# Altium footprint library FTP.PcbLib: 70 footprints (part 3 of 5)
Each footprint in its own frame and in the unit in brackets; x right, y up, seen from the top. Pads: shape width x height; smd on the part's side, far side on the other; paste and mask are expansions set on the pad; w line width, h text height; cw(c..) or ccw(c..) is an arc to the next point about the centre after c.
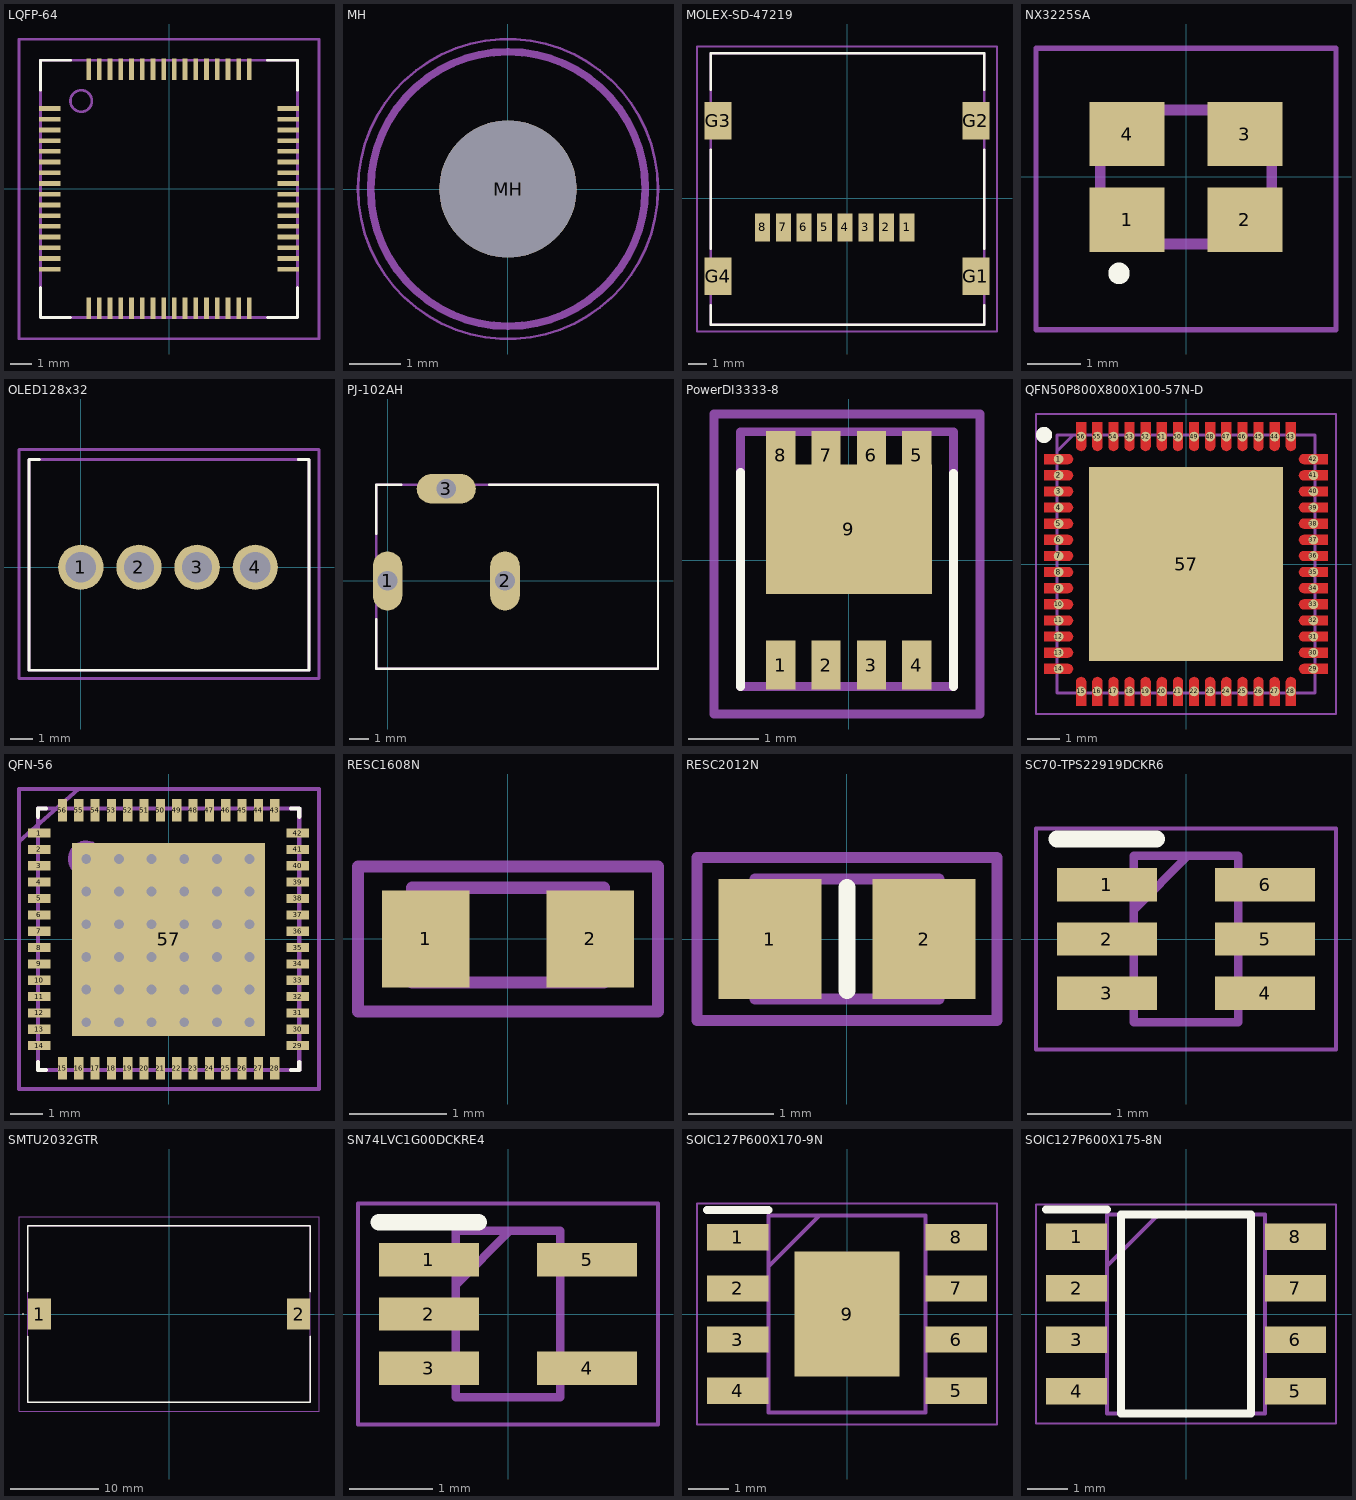
[diagram p2: the footprints below, top view; thin cyan lines are the x and y axes]

## LQFP-64 [mm]
height 1.6
pads (64):
  rect 1x0.22 smd: 1(-5.575,3.75) 2(-5.575,3.25) 3(-5.575,2.75) 4(-5.575,2.25) 5(-5.575,1.75) 6(-5.575,1.25) 7(-5.575,0.75) 8(-5.575,0.25) 9(-5.575,-0.25) 10(-5.575,-0.75) 11(-5.575,-1.25) 12(-5.575,-1.75) 13(-5.575,-2.25) 14(-5.575,-2.75) 15(-5.575,-3.25) 16(-5.575,-3.75) 33(5.575,-3.75) 34(5.575,-3.25) 35(5.575,-2.75) 36(5.575,-2.25) 37(5.575,-1.75) 38(5.575,-1.25) 39(5.575,-0.75) 40(5.575,-0.25) 41(5.575,0.25) 42(5.575,0.75) 43(5.575,1.25) 44(5.575,1.75) 45(5.575,2.25) 46(5.575,2.75) 47(5.575,3.25) 48(5.575,3.75)
  rect 0.22x1 smd: 17(-3.75,-5.575) 18(-3.25,-5.575) 19(-2.75,-5.575) 20(-2.25,-5.575) 21(-1.75,-5.575) 22(-1.25,-5.575) 23(-0.75,-5.575) 24(-0.25,-5.575) 25(0.25,-5.575) 26(0.75,-5.575) 27(1.25,-5.575) 28(1.75,-5.575) 29(2.25,-5.575) 30(2.75,-5.575) 31(3.25,-5.575) 32(3.75,-5.575) 49(3.75,5.575) 50(3.25,5.575) 51(2.75,5.575) 52(2.25,5.575) 53(1.75,5.575) 54(1.25,5.575) 55(0.75,5.575) 56(0.25,5.575) 57(-0.25,5.575) 58(-0.75,5.575) 59(-1.25,5.575) 60(-1.75,5.575) 61(-2.25,5.575) 62(-2.75,5.575) 63(-3.25,5.575) 64(-3.75,5.575)
Top Overlay:
  lines w0.127: -6,-5.999 -6,-4.599 ; -6,4.6 -6,6 -4.6,6 ; -5.994,-5.999 -4.594,-5.999 ; 4.6,-6 6,-6 6,-4.6 ; 4.6,6 6,6 6,4.6
  text "." at -8.233,3.735 h0.76
Mechanical 13:
  circle w0.127: c-4.1,4.1 r0.5
  lines w0.127: -6,-6 6,-6 6,6 -6,6 -6,-6
Mechanical 15:
  lines w0.127: -7,-7 -7,6.986 7,6.986 7,-7 -7,-7
  text "+" at -0.493,-0.769 h1.5
3D body: height 1.6, standoff 0.05, extent 0,0 0,0
3D body "FT2232HL.stp": height 1.6, standoff 0, extent -6,-6 6,6

## MH [mm]
pads (1):
  round 2.7 hole 2.7 paste-2539.97 mask+1.7: MH(0,0)
Mechanical 4:
  circle w0.05: c0,0 r2.95
Mechanical 7:
  circle w0.15: c0,0 r2.7

## MOLEX-SD-47219 [mm]
pads (12):
  rect 0.8x1.5 smd paste-0.1 mask+0.07: 1(3.205,-1.55) 2(2.105,-1.55) 3(1.005,-1.55) 4(-0.095,-1.55) 5(-1.195,-1.55) 6(-2.295,-1.55) 7(-3.395,-1.55) 8(-4.495,-1.55)
  rect 1.45x2 smd paste-0.1 mask+0.07: G1(6.875,-4.15) G2(6.875,4.15) G3(-6.875,4.15) G4(-6.875,-4.15)
Top Overlay:
  lines w0.127: -7.275,-5.7 -7.275,-6.75 7.325,-6.75 7.325,-5.7 ; -7.275,-2.7 -7.275,2.6 ; -7.275,5.8 -7.275,7.75 7.325,7.75 7.325,5.8 ; 7.325,-2.7 7.325,2.6
  text "." at 3.3,-7.7 h0.76
Mechanical 13:
  lines w0.127: -7.275,-6.75 7.325,-6.75 7.325,7.75 -7.275,7.75 -7.275,-6.75
Mechanical 15:
  lines w0.127: -8,-7.1 -8,8.1 8,8.1 8,-7.1 -8,-7.1
  text "+" at 0.5,0.7 h1.5
3D body "472192001.stp": height 2.06, standoff 0.17, extent -7.275,-6.75 7.325,7.75

## NX3225SA [mm]
pads (4):
  rect 1.4x1.2 smd: 1(-1.1,-0.8) 2(1.1,-0.8) 3(1.1,0.8) 4(-1.1,0.8)
Top Overlay:
  lines w0.3: -1.3,-1.8 ccw(c-1.25,-1.8) -1.2,-1.8 ccw(c-1.25,-1.8) -1.3,-1.8
Mechanical 15:
  lines w0.2: -1.6,-1.25 -1.6,1.25 1.6,1.25 1.6,-1.25 -1.6,-1.25
Mechanical 20:
  lines w0.1: -2.8,-2.85 -2.8,2.4 2.8,2.4 2.8,-2.85 -2.8,-2.85
3D body "NX3225SA-12MHZ-STD-CSR-6.stp": height 0.7, standoff 0, extent -1.6,-1.25 1.6,1.25

## OLED128x32 [mm]
pads (4):
  round 1.98 hole 1.32: 1(0,0) 2(2.54,0) 3(5.08,0) 4(7.62,0)
Top Overlay:
  lines w0.127: -1.8,4.7 -2.258,4.7 -2.258,-4.5 9.962,-4.5 9.962,4.7 9.5,4.7
  text "." at -3.5,1.5 h0.76
Mechanical 13:
  lines w0.127: -2.258,-4.5 9.962,-4.5 9.962,4.7 -2.258,4.7 -2.258,-4.5
Mechanical 15:
  lines w0.127: -2.7,-4.857 10.405,-4.857 10.405,5.143 -2.7,5.143 -2.7,-4.857
3D body "CES-104-02-S-S.stp": height 5.08, standoff -5.66, extent -1.08,-1.464 9.08,1.584

## PJ-102AH [mm]
pads (3):
  oval 1.508x3.016 hole 1 square: 1(0,0) 2(6,0)
  oval 3.016x1.508 hole 1 square: 3(3,4.7)
Top Overlay:
  lines w0.127: -0.587,-1.968 -0.587,-4.484 13.813,-4.484 13.813,4.916 5.2,4.916 ; -0.587,2.4 -0.587,4.916 0.7,4.916
  text "." at -2.1,0 h0.76
Mechanical 13:
  lines w0.127: -0.587,-4.484 13.813,-4.484 13.813,4.916 -0.587,4.916 -0.587,-4.484
Mechanical 15:
  lines w0.127: -0.587,-4.484 13.813,-4.484 13.813,4.916 -0.587,4.916 -0.587,-4.484
3D body "CUI_DEVICES_PJ-102AH.step": height 11.05, standoff -3.45, extent -0.587,-4.484 13.813,4.916

## PowerDI3333-8 [mm]
pads (9):
  rect 0.42x0.7 smd paste-0.01 mask+0.07: 1(-0.975,-1.5) 2(-0.325,-1.5) 3(0.325,-1.5) 4(0.975,-1.5)
  rect 0.42x0.7 smd paste-10 mask+0.07: 5(0.975,1.5) 6(0.325,1.5) 7(-0.325,1.5) 8(-0.975,1.5)
  rect 2.37x1.85 smd paste-10 mask+0.07: 9(0.003,0.443)
Top Overlay:
  lines w0.127: -1.55,-1.808 -1.55,1.257 ; 1.5,-1.808 1.5,1.242
  text "." at -1.075,-2.7 h0.76
Top Paste:
  region: -0.114,-0.404 -0.114,0.627 -1.114,0.627 -1.114,-0.404
  region: 0.114,-0.404 0.114,0.627 1.096,0.627 1.096,-0.404
  region: 1.096,1.837 1.096,0.867 0.116,0.867 0.116,1.315 0.186,1.315 0.186,1.837 0.446,1.837 0.446,1.315 0.836,1.315 0.836,1.837
  region: -1.108,1.838 -1.108,0.868 -0.115,0.868 -0.115,1.316 -0.198,1.316 -0.198,1.838 -0.458,1.838 -0.458,1.316 -0.848,1.316 -0.848,1.838
Mechanical 13:
  lines w0.127: -1.55,-1.808 1.5,-1.808 1.5,1.837 -1.55,1.837 -1.55,-1.808
Mechanical 15:
  lines w0.127: -1.925,-2.2 -1.925,2.091 1.875,2.091 1.875,-2.2 -1.925,-2.2
  text "+" at -0.489,-0.763 h1.5
3D body "DMP3013SFV-7.stp": height 0.95, standoff 0, extent -1.55,-1.83 1.5,1.786

## QFN50P800X800X100-57N-D [mm]
pads (57):
  round 0.3 smd: 1(-3.95,3.25) 2(-3.95,2.75) 3(-3.95,2.25) 4(-3.95,1.75) 5(-3.95,1.25) 6(-3.95,0.75) 7(-3.95,0.25) 8(-3.95,-0.25) 9(-3.95,-0.75) 10(-3.95,-1.25) 11(-3.95,-1.75) 12(-3.95,-2.25) 13(-3.95,-2.75) 14(-3.95,-3.25) 15(-3.25,-3.95) 16(-2.75,-3.95) 17(-2.25,-3.95) 18(-1.75,-3.95) 19(-1.25,-3.95) 20(-0.75,-3.95) 21(-0.25,-3.95) 22(0.25,-3.95) 23(0.75,-3.95) 24(1.25,-3.95) 25(1.75,-3.95) 26(2.25,-3.95) 27(2.75,-3.95) 28(3.25,-3.95) 29(3.95,-3.25) 30(3.95,-2.75) 31(3.95,-2.25) 32(3.95,-1.75) 33(3.95,-1.25) 34(3.95,-0.75) 35(3.95,-0.25) 36(3.95,0.25) 37(3.95,0.75) 38(3.95,1.25) 39(3.95,1.75) 40(3.95,2.25) 41(3.95,2.75) 42(3.95,3.25) 43(3.25,3.95) 44(2.75,3.95) 45(2.25,3.95) 46(1.75,3.95) 47(1.25,3.95) 48(0.75,3.95) 49(0.25,3.95) 50(-0.25,3.95) 51(-0.75,3.95) 52(-1.25,3.95) 53(-1.75,3.95) 54(-2.25,3.95) 55(-2.75,3.95) 56(-3.25,3.95)
  rrect0% 6x6 smd: 57(0,0)
Top Layer:
  region: -4.4,3.4 -3.65,3.401 -3.611,3.396 -3.574,3.381 -3.543,3.357 -3.519,3.326 -3.504,3.289 -3.499,3.25 -3.504,3.211 -3.519,3.174 -3.543,3.143 -3.574,3.119 -3.611,3.104 -3.65,3.099 -3.65,3.1 -4.4,3.1
  region: -4.4,2.9 -3.65,2.901 -3.611,2.896 -3.574,2.881 -3.543,2.857 -3.519,2.826 -3.504,2.789 -3.499,2.75 -3.504,2.711 -3.519,2.674 -3.543,2.643 -3.574,2.619 -3.611,2.604 -3.65,2.599 -3.65,2.6 -4.4,2.6
  region: -4.4,2.4 -3.65,2.401 -3.611,2.396 -3.574,2.381 -3.543,2.357 -3.519,2.326 -3.504,2.289 -3.499,2.25 -3.504,2.211 -3.519,2.174 -3.543,2.143 -3.574,2.119 -3.611,2.104 -3.65,2.099 -3.65,2.1 -4.4,2.1
  region: -4.4,1.9 -3.65,1.901 -3.611,1.896 -3.574,1.881 -3.543,1.857 -3.519,1.826 -3.504,1.789 -3.499,1.75 -3.504,1.711 -3.519,1.674 -3.543,1.643 -3.574,1.619 -3.611,1.604 -3.65,1.599 -3.65,1.6 -4.4,1.6
  region: -4.4,1.4 -3.65,1.401 -3.611,1.396 -3.574,1.381 -3.543,1.357 -3.519,1.326 -3.504,1.289 -3.499,1.25 -3.504,1.211 -3.519,1.174 -3.543,1.143 -3.574,1.119 -3.611,1.104 -3.65,1.099 -3.65,1.1 -4.4,1.1
  region: -4.4,0.9 -3.65,0.901 -3.611,0.896 -3.574,0.881 -3.543,0.857 -3.519,0.826 -3.504,0.789 -3.499,0.75 -3.504,0.711 -3.519,0.674 -3.543,0.643 -3.574,0.619 -3.611,0.604 -3.65,0.599 -3.65,0.6 -4.4,0.6
  region: -4.4,0.4 -3.65,0.401 -3.611,0.396 -3.574,0.381 -3.543,0.357 -3.519,0.326 -3.504,0.289 -3.499,0.25 -3.504,0.211 -3.519,0.174 -3.543,0.143 -3.574,0.119 -3.611,0.104 -3.65,0.099 -3.65,0.1 -4.4,0.1
  region: -4.4,-0.1 -3.65,-0.099 -3.611,-0.104 -3.574,-0.119 -3.543,-0.143 -3.519,-0.174 -3.504,-0.211 -3.499,-0.25 -3.504,-0.289 -3.519,-0.326 -3.543,-0.357 -3.574,-0.381 -3.611,-0.396 -3.65,-0.401 -3.65,-0.4 -4.4,-0.4
  region: -4.4,-0.6 -3.65,-0.599 -3.611,-0.604 -3.574,-0.619 -3.543,-0.643 -3.519,-0.674 -3.504,-0.711 -3.499,-0.75 -3.504,-0.789 -3.519,-0.826 -3.543,-0.857 -3.574,-0.881 -3.611,-0.896 -3.65,-0.901 -3.65,-0.9 -4.4,-0.9
  region: -4.4,-1.1 -3.65,-1.099 -3.611,-1.104 -3.574,-1.119 -3.543,-1.143 -3.519,-1.174 -3.504,-1.211 -3.499,-1.25 -3.504,-1.289 -3.519,-1.326 -3.543,-1.357 -3.574,-1.381 -3.611,-1.396 -3.65,-1.401 -3.65,-1.4 -4.4,-1.4
  region: -4.4,-1.6 -3.65,-1.599 -3.611,-1.604 -3.574,-1.619 -3.543,-1.643 -3.519,-1.674 -3.504,-1.711 -3.499,-1.75 -3.504,-1.789 -3.519,-1.826 -3.543,-1.857 -3.574,-1.881 -3.611,-1.896 -3.65,-1.901 -3.65,-1.9 -4.4,-1.9
  region: -4.4,-2.1 -3.65,-2.099 -3.611,-2.104 -3.574,-2.119 -3.543,-2.143 -3.519,-2.174 -3.504,-2.211 -3.499,-2.25 -3.504,-2.289 -3.519,-2.326 -3.543,-2.357 -3.574,-2.381 -3.611,-2.396 -3.65,-2.401 -3.65,-2.4 -4.4,-2.4
  region: -4.4,-2.6 -3.65,-2.599 -3.611,-2.604 -3.574,-2.619 -3.543,-2.643 -3.519,-2.674 -3.504,-2.711 -3.499,-2.75 -3.504,-2.789 -3.519,-2.826 -3.543,-2.857 -3.574,-2.881 -3.611,-2.896 -3.65,-2.901 -3.65,-2.9 -4.4,-2.9
  region: -4.4,-3.1 -3.65,-3.099 -3.611,-3.104 -3.574,-3.119 -3.543,-3.143 -3.519,-3.174 -3.504,-3.211 -3.499,-3.25 -3.504,-3.289 -3.519,-3.326 -3.543,-3.357 -3.574,-3.381 -3.611,-3.396 -3.65,-3.401 -3.65,-3.4 -4.4,-3.4
  region: -3.4,-4.4 -3.401,-3.65 -3.396,-3.611 -3.381,-3.574 -3.357,-3.543 -3.326,-3.519 -3.289,-3.504 -3.25,-3.499 -3.211,-3.504 -3.174,-3.519 -3.143,-3.543 -3.119,-3.574 -3.104,-3.611 -3.099,-3.65 -3.1,-3.65 -3.1,-4.4
  region: -2.9,-4.4 -2.901,-3.65 -2.896,-3.611 -2.881,-3.574 -2.857,-3.543 -2.826,-3.519 -2.789,-3.504 -2.75,-3.499 -2.711,-3.504 -2.674,-3.519 -2.643,-3.543 -2.619,-3.574 -2.604,-3.611 -2.599,-3.65 -2.6,-3.65 -2.6,-4.4
  region: -2.4,-4.4 -2.401,-3.65 -2.396,-3.611 -2.381,-3.574 -2.357,-3.543 -2.326,-3.519 -2.289,-3.504 -2.25,-3.499 -2.211,-3.504 -2.174,-3.519 -2.143,-3.543 -2.119,-3.574 -2.104,-3.611 -2.099,-3.65 -2.1,-3.65 -2.1,-4.4
  region: -1.9,-4.4 -1.901,-3.65 -1.896,-3.611 -1.881,-3.574 -1.857,-3.543 -1.826,-3.519 -1.789,-3.504 -1.75,-3.499 -1.711,-3.504 -1.674,-3.519 -1.643,-3.543 -1.619,-3.574 -1.604,-3.611 -1.599,-3.65 -1.6,-3.65 -1.6,-4.4
  region: -1.4,-4.4 -1.401,-3.65 -1.396,-3.611 -1.381,-3.574 -1.357,-3.543 -1.326,-3.519 -1.289,-3.504 -1.25,-3.499 -1.211,-3.504 -1.174,-3.519 -1.143,-3.543 -1.119,-3.574 -1.104,-3.611 -1.099,-3.65 -1.1,-3.65 -1.1,-4.4
  region: -0.9,-4.4 -0.901,-3.65 -0.896,-3.611 -0.881,-3.574 -0.857,-3.543 -0.826,-3.519 -0.789,-3.504 -0.75,-3.499 -0.711,-3.504 -0.674,-3.519 -0.643,-3.543 -0.619,-3.574 -0.604,-3.611 -0.599,-3.65 -0.6,-3.65 -0.6,-4.4
  region: -0.4,-4.4 -0.401,-3.65 -0.396,-3.611 -0.381,-3.574 -0.357,-3.543 -0.326,-3.519 -0.289,-3.504 -0.25,-3.499 -0.211,-3.504 -0.174,-3.519 -0.143,-3.543 -0.119,-3.574 -0.104,-3.611 -0.099,-3.65 -0.1,-3.65 -0.1,-4.4
  region: 0.1,-4.4 0.099,-3.65 0.104,-3.611 0.119,-3.574 0.143,-3.543 0.174,-3.519 0.211,-3.504 0.25,-3.499 0.289,-3.504 0.326,-3.519 0.357,-3.543 0.381,-3.574 0.396,-3.611 0.401,-3.65 0.4,-3.65 0.4,-4.4
  region: 0.6,-4.4 0.599,-3.65 0.604,-3.611 0.619,-3.574 0.643,-3.543 0.674,-3.519 0.711,-3.504 0.75,-3.499 0.789,-3.504 0.826,-3.519 0.857,-3.543 0.881,-3.574 0.896,-3.611 0.901,-3.65 0.9,-3.65 0.9,-4.4
  region: 1.1,-4.4 1.099,-3.65 1.104,-3.611 1.119,-3.574 1.143,-3.543 1.174,-3.519 1.211,-3.504 1.25,-3.499 1.289,-3.504 1.326,-3.519 1.357,-3.543 1.381,-3.574 1.396,-3.611 1.401,-3.65 1.4,-3.65 1.4,-4.4
  region: 1.6,-4.4 1.599,-3.65 1.604,-3.611 1.619,-3.574 1.643,-3.543 1.674,-3.519 1.711,-3.504 1.75,-3.499 1.789,-3.504 1.826,-3.519 1.857,-3.543 1.881,-3.574 1.896,-3.611 1.901,-3.65 1.9,-3.65 1.9,-4.4
  region: 2.1,-4.4 2.099,-3.65 2.104,-3.611 2.119,-3.574 2.143,-3.543 2.174,-3.519 2.211,-3.504 2.25,-3.499 2.289,-3.504 2.326,-3.519 2.357,-3.543 2.381,-3.574 2.396,-3.611 2.401,-3.65 2.4,-3.65 2.4,-4.4
  region: 2.6,-4.4 2.599,-3.65 2.604,-3.611 2.619,-3.574 2.643,-3.543 2.674,-3.519 2.711,-3.504 2.75,-3.499 2.789,-3.504 2.826,-3.519 2.857,-3.543 2.881,-3.574 2.896,-3.611 2.901,-3.65 2.9,-3.65 2.9,-4.4
  region: 3.1,-4.4 3.099,-3.65 3.104,-3.611 3.119,-3.574 3.143,-3.543 3.174,-3.519 3.211,-3.504 3.25,-3.499 3.289,-3.504 3.326,-3.519 3.357,-3.543 3.381,-3.574 3.396,-3.611 3.401,-3.65 3.4,-3.65 3.4,-4.4
  region: 4.4,-3.4 3.65,-3.401 3.611,-3.396 3.574,-3.381 3.543,-3.357 3.519,-3.326 3.504,-3.289 3.499,-3.25 3.504,-3.211 3.519,-3.174 3.543,-3.143 3.574,-3.119 3.611,-3.104 3.65,-3.099 3.65,-3.1 4.4,-3.1
  region: 4.4,-2.9 3.65,-2.901 3.611,-2.896 3.574,-2.881 3.543,-2.857 3.519,-2.826 3.504,-2.789 3.499,-2.75 3.504,-2.711 3.519,-2.674 3.543,-2.643 3.574,-2.619 3.611,-2.604 3.65,-2.599 3.65,-2.6 4.4,-2.6
  region: 4.4,-2.4 3.65,-2.401 3.611,-2.396 3.574,-2.381 3.543,-2.357 3.519,-2.326 3.504,-2.289 3.499,-2.25 3.504,-2.211 3.519,-2.174 3.543,-2.143 3.574,-2.119 3.611,-2.104 3.65,-2.099 3.65,-2.1 4.4,-2.1
  region: 4.4,-1.9 3.65,-1.901 3.611,-1.896 3.574,-1.881 3.543,-1.857 3.519,-1.826 3.504,-1.789 3.499,-1.75 3.504,-1.711 3.519,-1.674 3.543,-1.643 3.574,-1.619 3.611,-1.604 3.65,-1.599 3.65,-1.6 4.4,-1.6
  region: 4.4,-1.4 3.65,-1.401 3.611,-1.396 3.574,-1.381 3.543,-1.357 3.519,-1.326 3.504,-1.289 3.499,-1.25 3.504,-1.211 3.519,-1.174 3.543,-1.143 3.574,-1.119 3.611,-1.104 3.65,-1.099 3.65,-1.1 4.4,-1.1
  region: 4.4,-0.9 3.65,-0.901 3.611,-0.896 3.574,-0.881 3.543,-0.857 3.519,-0.826 3.504,-0.789 3.499,-0.75 3.504,-0.711 3.519,-0.674 3.543,-0.643 3.574,-0.619 3.611,-0.604 3.65,-0.599 3.65,-0.6 4.4,-0.6
  region: 4.4,-0.4 3.65,-0.401 3.611,-0.396 3.574,-0.381 3.543,-0.357 3.519,-0.326 3.504,-0.289 3.499,-0.25 3.504,-0.211 3.519,-0.174 3.543,-0.143 3.574,-0.119 3.611,-0.104 3.65,-0.099 3.65,-0.1 4.4,-0.1
  region: 4.4,0.1 3.65,0.099 3.611,0.104 3.574,0.119 3.543,0.143 3.519,0.174 3.504,0.211 3.499,0.25 3.504,0.289 3.519,0.326 3.543,0.357 3.574,0.381 3.611,0.396 3.65,0.401 3.65,0.4 4.4,0.4
  region: 4.4,0.6 3.65,0.599 3.611,0.604 3.574,0.619 3.543,0.643 3.519,0.674 3.504,0.711 3.499,0.75 3.504,0.789 3.519,0.826 3.543,0.857 3.574,0.881 3.611,0.896 3.65,0.901 3.65,0.9 4.4,0.9
  region: 4.4,1.1 3.65,1.099 3.611,1.104 3.574,1.119 3.543,1.143 3.519,1.174 3.504,1.211 3.499,1.25 3.504,1.289 3.519,1.326 3.543,1.357 3.574,1.381 3.611,1.396 3.65,1.401 3.65,1.4 4.4,1.4
  region: 4.4,1.6 3.65,1.599 3.611,1.604 3.574,1.619 3.543,1.643 3.519,1.674 3.504,1.711 3.499,1.75 3.504,1.789 3.519,1.826 3.543,1.857 3.574,1.881 3.611,1.896 3.65,1.901 3.65,1.9 4.4,1.9
  region: 4.4,2.1 3.65,2.099 3.611,2.104 3.574,2.119 3.543,2.143 3.519,2.174 3.504,2.211 3.499,2.25 3.504,2.289 3.519,2.326 3.543,2.357 3.574,2.381 3.611,2.396 3.65,2.401 3.65,2.4 4.4,2.4
  region: 4.4,2.6 3.65,2.599 3.611,2.604 3.574,2.619 3.543,2.643 3.519,2.674 3.504,2.711 3.499,2.75 3.504,2.789 3.519,2.826 3.543,2.857 3.574,2.881 3.611,2.896 3.65,2.901 3.65,2.9 4.4,2.9
  region: 4.4,3.1 3.65,3.099 3.611,3.104 3.574,3.119 3.543,3.143 3.519,3.174 3.504,3.211 3.499,3.25 3.504,3.289 3.519,3.326 3.543,3.357 3.574,3.381 3.611,3.396 3.65,3.401 3.65,3.4 4.4,3.4
  region: 3.4,4.4 3.401,3.65 3.396,3.611 3.381,3.574 3.357,3.543 3.326,3.519 3.289,3.504 3.25,3.499 3.211,3.504 3.174,3.519 3.143,3.543 3.119,3.574 3.104,3.611 3.099,3.65 3.1,3.65 3.1,4.4
  region: 2.9,4.4 2.901,3.65 2.896,3.611 2.881,3.574 2.857,3.543 2.826,3.519 2.789,3.504 2.75,3.499 2.711,3.504 2.674,3.519 2.643,3.543 2.619,3.574 2.604,3.611 2.599,3.65 2.6,3.65 2.6,4.4
  region: 2.4,4.4 2.401,3.65 2.396,3.611 2.381,3.574 2.357,3.543 2.326,3.519 2.289,3.504 2.25,3.499 2.211,3.504 2.174,3.519 2.143,3.543 2.119,3.574 2.104,3.611 2.099,3.65 2.1,3.65 2.1,4.4
  region: 1.9,4.4 1.901,3.65 1.896,3.611 1.881,3.574 1.857,3.543 1.826,3.519 1.789,3.504 1.75,3.499 1.711,3.504 1.674,3.519 1.643,3.543 1.619,3.574 1.604,3.611 1.599,3.65 1.6,3.65 1.6,4.4
  region: 1.4,4.4 1.401,3.65 1.396,3.611 1.381,3.574 1.357,3.543 1.326,3.519 1.289,3.504 1.25,3.499 1.211,3.504 1.174,3.519 1.143,3.543 1.119,3.574 1.104,3.611 1.099,3.65 1.1,3.65 1.1,4.4
  region: 0.9,4.4 0.901,3.65 0.896,3.611 0.881,3.574 0.857,3.543 0.826,3.519 0.789,3.504 0.75,3.499 0.711,3.504 0.674,3.519 0.643,3.543 0.619,3.574 0.604,3.611 0.599,3.65 0.6,3.65 0.6,4.4
  region: 0.4,4.4 0.401,3.65 0.396,3.611 0.381,3.574 0.357,3.543 0.326,3.519 0.289,3.504 0.25,3.499 0.211,3.504 0.174,3.519 0.143,3.543 0.119,3.574 0.104,3.611 0.099,3.65 0.1,3.65 0.1,4.4
  region: -0.1,4.4 -0.099,3.65 -0.104,3.611 -0.119,3.574 -0.143,3.543 -0.174,3.519 -0.211,3.504 -0.25,3.499 -0.289,3.504 -0.326,3.519 -0.357,3.543 -0.381,3.574 -0.396,3.611 -0.401,3.65 -0.4,3.65 -0.4,4.4
  region: -0.6,4.4 -0.599,3.65 -0.604,3.611 -0.619,3.574 -0.643,3.543 -0.674,3.519 -0.711,3.504 -0.75,3.499 -0.789,3.504 -0.826,3.519 -0.857,3.543 -0.881,3.574 -0.896,3.611 -0.901,3.65 -0.9,3.65 -0.9,4.4
  region: -1.1,4.4 -1.099,3.65 -1.104,3.611 -1.119,3.574 -1.143,3.543 -1.174,3.519 -1.211,3.504 -1.25,3.499 -1.289,3.504 -1.326,3.519 -1.357,3.543 -1.381,3.574 -1.396,3.611 -1.401,3.65 -1.4,3.65 -1.4,4.4
  region: -1.6,4.4 -1.599,3.65 -1.604,3.611 -1.619,3.574 -1.643,3.543 -1.674,3.519 -1.711,3.504 -1.75,3.499 -1.789,3.504 -1.826,3.519 -1.857,3.543 -1.881,3.574 -1.896,3.611 -1.901,3.65 -1.9,3.65 -1.9,4.4
  region: -2.1,4.4 -2.099,3.65 -2.104,3.611 -2.119,3.574 -2.143,3.543 -2.174,3.519 -2.211,3.504 -2.25,3.499 -2.289,3.504 -2.326,3.519 -2.357,3.543 -2.381,3.574 -2.396,3.611 -2.401,3.65 -2.4,3.65 -2.4,4.4
  region: -2.6,4.4 -2.599,3.65 -2.604,3.611 -2.619,3.574 -2.643,3.543 -2.674,3.519 -2.711,3.504 -2.75,3.499 -2.789,3.504 -2.826,3.519 -2.857,3.543 -2.881,3.574 -2.896,3.611 -2.901,3.65 -2.9,3.65 -2.9,4.4
  region: -3.1,4.4 -3.099,3.65 -3.104,3.611 -3.119,3.574 -3.143,3.543 -3.174,3.519 -3.211,3.504 -3.25,3.499 -3.289,3.504 -3.326,3.519 -3.357,3.543 -3.381,3.574 -3.396,3.611 -3.401,3.65 -3.4,3.65 -3.4,4.4
Top Overlay:
  circle w0.25: c-4.4,4 r0.125
Mechanical 15:
  lines w0.1: -4,3.5 -3.5,4 ; -4,-4 4,-4 4,4 -4,4 -4,-4
Mechanical 20:
  lines w0.05: -4.65,-4.65 4.65,-4.65 4.65,4.65 -4.65,4.65 -4.65,-4.65
3D body "LAN9500A-ABZJ-TR.stp": height 1, standoff 0, extent -4.05,-4.05 4.05,4.05

## QFN-56 [mm]
pads (57):
  rect 0.69x0.28 smd mask+0.07: 1(-3.95,3.25) 2(-3.95,2.75) 3(-3.95,2.25) 4(-3.95,1.75) 5(-3.95,1.25) 6(-3.95,0.75) 7(-3.95,0.25) 8(-3.95,-0.25) 9(-3.95,-0.75) 10(-3.95,-1.25) 11(-3.95,-1.75) 12(-3.95,-2.25) 13(-3.95,-2.75) 14(-3.95,-3.25) 29(3.95,-3.25) 30(3.95,-2.75) 31(3.95,-2.25) 32(3.95,-1.75) 33(3.95,-1.25) 34(3.95,-0.75) 35(3.95,-0.25) 36(3.95,0.25) 37(3.95,0.75) 38(3.95,1.25) 39(3.95,1.75) 40(3.95,2.25) 41(3.95,2.75) 42(3.95,3.25)
  rect 0.28x0.69 smd mask+0.07: 15(-3.25,-3.95) 16(-2.75,-3.95) 17(-2.25,-3.95) 18(-1.75,-3.95) 19(-1.25,-3.95) 20(-0.75,-3.95) 21(-0.25,-3.95) 22(0.25,-3.95) 23(0.75,-3.95) 24(1.25,-3.95) 25(1.75,-3.95) 26(2.25,-3.95) 27(2.75,-3.95) 28(3.25,-3.95) 43(3.25,3.95) 44(2.75,3.95) 45(2.25,3.95) 46(1.75,3.95) 47(1.25,3.95) 48(0.75,3.95) 49(0.25,3.95) 50(-0.25,3.95) 51(-0.75,3.95) 52(-1.25,3.95) 53(-1.75,3.95) 54(-2.25,3.95) 55(-2.75,3.95) 56(-3.25,3.95)
  rrect0% 5.9x5.9 smd mask+0.07: 57(0,0)
via -2.519,-2.539 diameter 0.7 hole 0.3
via -1.519,-2.539 diameter 0.7 hole 0.3
via -0.519,-2.539 diameter 0.7 hole 0.3
via 0.481,-2.539 diameter 0.7 hole 0.3
via 1.481,-2.539 diameter 0.7 hole 0.3
via 2.481,-2.539 diameter 0.7 hole 0.3
via -2.519,-1.539 diameter 0.7 hole 0.3
via -1.519,-1.539 diameter 0.7 hole 0.3
via -0.519,-1.539 diameter 0.7 hole 0.3
via 0.481,-1.539 diameter 0.7 hole 0.3
via 1.481,-1.539 diameter 0.7 hole 0.3
via 2.481,-1.539 diameter 0.7 hole 0.3
via -2.519,-0.539 diameter 0.7 hole 0.3
via -1.519,-0.539 diameter 0.7 hole 0.3
via -0.519,-0.539 diameter 0.7 hole 0.3
via 0.481,-0.539 diameter 0.7 hole 0.3
via 1.481,-0.539 diameter 0.7 hole 0.3
via 2.481,-0.539 diameter 0.7 hole 0.3
via -2.519,0.461 diameter 0.7 hole 0.3
via -1.519,0.461 diameter 0.7 hole 0.3
via -0.519,0.461 diameter 0.7 hole 0.3
via 0.481,0.461 diameter 0.7 hole 0.3
via 1.481,0.461 diameter 0.7 hole 0.3
via 2.481,0.461 diameter 0.7 hole 0.3
via -2.519,1.461 diameter 0.7 hole 0.3
via -1.519,1.461 diameter 0.7 hole 0.3
via -0.519,1.461 diameter 0.7 hole 0.3
via 0.481,1.461 diameter 0.7 hole 0.3
via 1.481,1.461 diameter 0.7 hole 0.3
via 2.481,1.461 diameter 0.7 hole 0.3
via -2.519,2.461 diameter 0.7 hole 0.3
via -1.519,2.461 diameter 0.7 hole 0.3
via -0.519,2.461 diameter 0.7 hole 0.3
via 0.481,2.461 diameter 0.7 hole 0.3
via 1.481,2.461 diameter 0.7 hole 0.3
via 2.481,2.461 diameter 0.7 hole 0.3
Top Overlay:
  lines w0.127: -3.999,-3.752 -3.999,-4.002 -3.749,-4.002 ; -3.999,3.75 -3.999,4 -3.749,4 ; 3.749,4.001 3.999,4.001 3.999,3.751 ; 3.751,-3.999 4.001,-3.999 4.001,-3.749
  text "." at -5.4,3.2 h0.76
Mechanical 13:
  circle w0.127: c-2.519,2.461 r0.5
  lines w0.127: -3.999,-4 -3.999,4.002 4,4.002 4,-4 -3.999,-4
Mechanical 15:
  lines w0.127: -4.571,2.997 -2.75,4.6 ; -4.573,-4.579 4.6,-4.579 4.6,4.6 -4.573,4.6 -4.573,-4.579
  text "+" at -0.493,-0.748 h1.5
3D body "LAN7500I-ABZJ.stp": height 1, standoff 0, extent -4.05,-4.05 4.05,4.05

## RESC1608N [mm] "Chip Resistor, Body 1.6x0.8mm, IPC Medium Density"
height 0.6
pads (2):
  rect 0.9x1 smd: 1(-0.85,0) 2(0.85,0)
Mechanical 13:
  lines w0.127: -0.988,-0.45 -0.988,0.529 0.988,0.529 0.988,-0.45 -0.988,-0.45
Mechanical 15:
  lines w0.127: -1.55,-0.75 1.55,-0.75 1.55,0.75 -1.55,0.75 -1.55,-0.75
  text "+" at -0.507,-0.759 h1.5
3D body "0603S1.STEP": height 0.43, standoff -0.02, extent -0.988,-0.45 0.988,0.529

## RESC2012N [mm] "Chip Resistor, Body 2.0x1.3mm, IPC Medium Density"
height 0.65
pads (2):
  rect 1.2x1.4 smd: 1(-0.9,0) 2(0.9,0)
Top Overlay:
  lines w0.2: 0,-0.6 0,0.6
Mechanical 13:
  lines w0.127: -1.075,-0.7 -1.075,0.7 1.075,0.7 1.075,-0.7 -1.075,-0.7
Mechanical 15:
  lines w0.127: -1.75,-0.95 -1.75,0.95 1.75,0.95 1.75,-0.95 -1.75,-0.95
  text "+" at -0.501,-0.764 h1.5
3D body: height 0.65, standoff 0, extent -1.075,-0.7 1.075,0.7

## SC70-TPS22919DCKR6 [mm]
pads (6):
  rect 1.2x0.4 smd: 1(-0.95,0.65) 2(-0.95,0) 3(-0.95,-0.65) 4(0.95,-0.65) 5(0.95,0) 6(0.95,0.65)
Top Overlay:
  lines w0.2: -1.55,1.2 -0.35,1.2
Mechanical 15:
  lines w0.1: -0.625,0.35 0.025,1 ; -0.625,-1 0.625,-1 0.625,1 -0.625,1 -0.625,-1
Mechanical 20:
  lines w0.05: -1.8,-1.325 1.8,-1.325 1.8,1.325 -1.8,1.325 -1.8,-1.325
3D body "TPS22919DCKR.stp": height 1.1, standoff 0, extent -1.025,-1 1.075,1

## SMTU2032GTR [mm]
pads (2):
  rect 2.6x3.5 smd: 1(-14.7,0) 2(14.7,0)
Top Overlay:
  lines w0.1: -16.6,0 cw(c-16.55,0) -16.5,0 cw(c-16.55,0) -16.6,0
  lines w0.2: -16,-2.54 -16,-10 16,-10 16,-2.54 ; -16,2.54 -16,10 16,10 16,2.54
Mechanical 15:
  lines w0.1: -16,-10 -16,10 16,10 16,-10 -16,-10
Mechanical 20:
  lines w0.1: -17,-11 -17,11 17,11 17,-11 -17,-11
3D body "SMTU2032-G.TR.stp": height 5.55, standoff 0, extent -15.9,-8.05 16.1,8.05
3D body "CR2032.stp": height 5, standoff 1.5, extent -10.2,-10.4 9.8,9.6

## SN74LVC1G00DCKRE4 [mm]
pads (5):
  rect 1.2x0.4 smd: 1(-0.95,0.65) 2(-0.95,0) 3(-0.95,-0.65) 4(0.95,-0.65) 5(0.95,0.65)
Top Overlay:
  lines w0.2: -1.55,1.1 -0.35,1.1
Mechanical 15:
  lines w0.1: -0.625,0.35 0.025,1 ; -0.625,-1 0.625,-1 0.625,1 -0.625,1 -0.625,-1
Mechanical 20:
  lines w0.05: -1.8,-1.325 1.8,-1.325 1.8,1.325 -1.8,1.325 -1.8,-1.325

## SOIC127P600X170-9N [mm]
pads (9):
  rect 1.525x0.65 smd: 1(-2.712,1.905) 2(-2.712,0.635) 3(-2.712,-0.635) 4(-2.712,-1.905) 5(2.712,-1.905) 6(2.712,-0.635) 7(2.712,0.635) 8(2.712,1.905)
  rect 2.6x3.1 smd: 9(0,0)
Top Overlay:
  lines w0.2: -3.475,2.58 -1.95,2.58
Mechanical 15:
  lines w0.1: -1.95,1.18 -0.68,2.45 ; -1.95,-2.45 1.95,-2.45 1.95,2.45 -1.95,2.45 -1.95,-2.45
Mechanical 20:
  lines w0.05: -3.725,-2.75 3.725,-2.75 3.725,2.75 -3.725,2.75 -3.725,-2.75
3D body "LMR33640DDDAR.stp": height 1.57, standoff 0, extent -3.014,-2.45 3.014,2.45

## SOIC127P600X175-8N [mm]
pads (8):
  rect 1.5x0.65 smd: 1(-2.7,1.905) 2(-2.7,0.635) 3(-2.7,-0.635) 4(-2.7,-1.905) 5(2.7,-1.905) 6(2.7,-0.635) 7(2.7,0.635) 8(2.7,1.905)
Top Overlay:
  lines w0.2: -3.45,2.58 -1.95,2.58 ; -1.6,-2.45 -1.6,2.45 1.6,2.45 1.6,-2.45 -1.6,-2.45
Mechanical 15:
  lines w0.1: -1.95,1.18 -0.68,2.45 ; -1.95,-2.45 -1.95,2.45 1.95,2.45 1.95,-2.45 -1.95,-2.45
Mechanical 20:
  lines w0.05: -3.7,-2.7 -3.7,2.7 3.7,2.7 3.7,-2.7 -3.7,-2.7
3D body "SN75176ADR.stp": height 1.63, standoff 0, extent -2.911,-2.551 3.111,2.351